# Altium schematic symbol library jlcpcb_2025_04_inductors_extended_0402.schlib: 1396 symbols (part 4 of 8) (continued)
## LQW15AN56NH00D
designator L?  Inductance: 56nH
Inductor, 56nH, ±3%, 1.17Ω, SMD 0402; Manufacturer: Murata Electronics; Manufacturer Part Number: LQW15AN56NH00D; Self-Resonant Frequency: 2.8GHz; Q Factor: 25@200MHz; Package Size: 0402; JLCPCB Basic Part: No; JLCPCB Part Number: C167483; Supplier 1: LCSC; Category: Inductors; Supplier Part Number 1: C167483; Tolerance: ±3%; DC Resistance: 1.17Ω; RoHS: Yes; ComponentLink1Description: Datasheet; ComponentLink1URL: https://wmsc.lcsc.com/wmsc/upload/file/pdf/v2/lcsc/2304140030_Murata-Electronics-LQW15AN56NH00D_C167483.pdf; ComponentLink2Description: JLCPCB Part URL; ComponentLink2URL: https://jlcpcb.com/partdetail/C167483; ComponentLink3Description: LCSC Part URL; ComponentLink3URL: https://lcsc.com/product-detail/Inductors-SMD_Murata-Electronics-Murata-Electronics-LQW15AN56NH00D_C167483.html
footprint IND-0402 (0402 (1005M) Inductor)
pins: 1, 2

## LQW15AN56NJ00D
designator L?  Inductance: 56nH
Inductor, 56nH, ±5%, 1.17Ω, 200mA, SMD 0402; Manufacturer: Murata Electronics; Manufacturer Part Number: LQW15AN56NJ00D; Self-Resonant Frequency: 2.8GHz; Q Factor: 25@200MHz; Package Size: 0402; JLCPCB Basic Part: No; JLCPCB Part Number: C167484; Supplier 1: LCSC; Category: Inductors; Supplier Part Number 1: C167484; Tolerance: ±5%; Rated Current: 200mA; DC Resistance: 1.17Ω; RoHS: Yes; ComponentLink1Description: Datasheet; ComponentLink1URL: https://wmsc.lcsc.com/wmsc/upload/file/pdf/v2/lcsc/2304140030_Murata-Electronics-LQW15AN56NJ00D_C167484.pdf; ComponentLink2Description: JLCPCB Part URL; ComponentLink2URL: https://jlcpcb.com/partdetail/C167484; ComponentLink3Description: LCSC Part URL; ComponentLink3URL: https://lcsc.com/product-detail/Inductors-SMD_Murata-Electronics-Murata-Electronics-LQW15AN56NJ00D_C167484.html
footprint IND-0402 (0402 (1005M) Inductor)
pins: 1, 2

## LQW15AN62NG00D
designator L?  Inductance: 62nH
Inductor, 62nH, ±2%, 1.82Ω, 145mA, SMD 0402; Manufacturer: Murata Electronics; Manufacturer Part Number: LQW15AN62NG00D; Self-Resonant Frequency: 2.6GHz; Q Factor: 20@200MHz; Package Size: 0402; JLCPCB Basic Part: No; JLCPCB Part Number: C167485; Supplier 1: LCSC; Category: Inductors; Supplier Part Number 1: C167485; Tolerance: ±2%; Rated Current: 145mA; DC Resistance: 1.82Ω; RoHS: Yes; ComponentLink1Description: Datasheet; ComponentLink1URL: https://wmsc.lcsc.com/wmsc/upload/file/pdf/v2/lcsc/2304140030_Murata-Electronics-LQW15AN62NG00D_C167485.pdf; ComponentLink2Description: JLCPCB Part URL; ComponentLink2URL: https://jlcpcb.com/partdetail/C167485; ComponentLink3Description: LCSC Part URL; ComponentLink3URL: https://lcsc.com/product-detail/Inductors-SMD_Murata-Electronics-Murata-Electronics-LQW15AN62NG00D_C167485.html
footprint IND-0402 (0402 (1005M) Inductor)
pins: 1, 2

## LQW15AN68NG00D
designator L?  Inductance: 68nH
Inductor, 68nH, ±2%, 1.96Ω, 140mA, SMD 0402; Manufacturer: Murata Electronics; Manufacturer Part Number: LQW15AN68NG00D; Self-Resonant Frequency: 2.5GHz; Q Factor: 20@200MHz; Package Size: 0402; JLCPCB Basic Part: No; JLCPCB Part Number: C108965; Supplier 1: LCSC; Category: Inductors; Supplier Part Number 1: C108965; Tolerance: ±2%; Rated Current: 140mA; DC Resistance: 1.96Ω; RoHS: Yes; ComponentLink1Description: Datasheet; ComponentLink1URL: https://wmsc.lcsc.com/wmsc/upload/file/pdf/v2/lcsc/1811081523_Murata-Electronics-LQW15AN68NG00D_C108965.pdf; ComponentLink2Description: JLCPCB Part URL; ComponentLink2URL: https://jlcpcb.com/partdetail/C108965; ComponentLink3Description: LCSC Part URL; ComponentLink3URL: https://lcsc.com/product-detail/Inductors-SMD_Murata-Electronics-Murata-Electronics-LQW15AN68NG00D_C108965.html
footprint IND-0402 (0402 (1005M) Inductor)
pins: 1, 2

## LQW15AN68NG8ZD
designator L?  Inductance: 68nH
Inductor, 68nH, ±2%, 1.128Ω, 320mA, SMD 0402; Manufacturer: Murata Electronics; Manufacturer Part Number: LQW15AN68NG8ZD; Self-Resonant Frequency: 2.5GHz; Q Factor: 25@200MHz; Package Size: 0402; JLCPCB Basic Part: No; JLCPCB Part Number: C2043784; Supplier 1: LCSC; Category: Inductors; Supplier Part Number 1: C2043784; Tolerance: ±2%; Rated Current: 320mA; DC Resistance: 1.128Ω; RoHS: Yes; ComponentLink1Description: Datasheet; ComponentLink1URL: https://wmsc.lcsc.com/wmsc/upload/file/pdf/v2/lcsc/2304140030_Murata-Electronics-LQW15AN68NG8ZD_C2043784.pdf; ComponentLink2Description: JLCPCB Part URL; ComponentLink2URL: https://jlcpcb.com/partdetail/C2043784; ComponentLink3Description: LCSC Part URL; ComponentLink3URL: https://lcsc.com/product-detail/Inductors-SMD_Murata-Electronics-Murata-Electronics-LQW15AN68NG8ZD_C2043784.html
footprint IND-0402 (0402 (1005M) Inductor)
pins: 1, 2

## LQW15AN68NJ80D
designator L?  Inductance: 68nH
Inductor, 68nH, ±5%, 1.128Ω, 320mA, SMD 0402; Manufacturer: Murata Electronics; Manufacturer Part Number: LQW15AN68NJ80D; Package Size: 0402; JLCPCB Basic Part: No; JLCPCB Part Number: C2041537; Supplier 1: LCSC; Category: Inductors; Supplier Part Number 1: C2041537; Tolerance: ±5%; Rated Current: 320mA; DC Resistance: 1.128Ω; RoHS: Yes; ComponentLink1Description: Datasheet; ComponentLink1URL: https://wmsc.lcsc.com/wmsc/upload/file/pdf/v2/lcsc/2304140030_Murata-Electronics-LQW15AN68NJ80D_C2041537.pdf; ComponentLink2Description: JLCPCB Part URL; ComponentLink2URL: https://jlcpcb.com/partdetail/C2041537; ComponentLink3Description: LCSC Part URL; ComponentLink3URL: https://lcsc.com/product-detail/Power-Inductors_Murata-Electronics-Murata-Electronics-LQW15AN68NJ80D_C2041537.html
footprint IND-0402 (0402 (1005M) Inductor)
pins: 1, 2

## LQW15AN75NG00D
designator L?  Inductance: 75nH
Inductor, 75nH, ±2%, 2.1Ω, 135mA, SMD 0402; Manufacturer: Murata Electronics; Manufacturer Part Number: LQW15AN75NG00D; Package Size: 0402; JLCPCB Basic Part: No; JLCPCB Part Number: C341787; Supplier 1: LCSC; Category: Inductors; Supplier Part Number 1: C341787; Tolerance: ±2%; Rated Current: 135mA; DC Resistance: 2.1Ω; RoHS: Yes; ComponentLink1Description: Datasheet; ComponentLink1URL: https://wmsc.lcsc.com/wmsc/upload/file/pdf/v2/lcsc/2304140030_Murata-Electronics-LQW15AN75NG00D_C341787.pdf; ComponentLink2Description: JLCPCB Part URL; ComponentLink2URL: https://jlcpcb.com/partdetail/C341787; ComponentLink3Description: LCSC Part URL; ComponentLink3URL: https://lcsc.com/product-detail/Power-Inductors_Murata-Electronics-Murata-Electronics-LQW15AN75NG00D_C341787.html
footprint IND-0402 (0402 (1005M) Inductor)
pins: 1, 2

## LQW15AN75NG80D
designator L?  Inductance: 75nH
Inductor, 75nH, ±2%, 1.224Ω, 320mA, SMD 0402; Manufacturer: Murata Electronics; Manufacturer Part Number: LQW15AN75NG80D; Package Size: 0402; JLCPCB Basic Part: No; JLCPCB Part Number: C2044453; Supplier 1: LCSC; Category: Inductors; Supplier Part Number 1: C2044453; Tolerance: ±2%; Rated Current: 320mA; DC Resistance: 1.224Ω; RoHS: Yes; ComponentLink1Description: Datasheet; ComponentLink1URL: https://wmsc.lcsc.com/wmsc/upload/file/pdf/v2/lcsc/2304140030_Murata-Electronics-LQW15AN75NG80D_C2044453.pdf; ComponentLink2Description: JLCPCB Part URL; ComponentLink2URL: https://jlcpcb.com/partdetail/C2044453; ComponentLink3Description: LCSC Part URL; ComponentLink3URL: https://lcsc.com/product-detail/Power-Inductors_Murata-Electronics-Murata-Electronics-LQW15AN75NG80D_C2044453.html
footprint IND-0402 (0402 (1005M) Inductor)
pins: 1, 2

## LQW15AN75NJ00D
designator L?  Inductance: 75nH
Inductor, 75nH, ±5%, 2.1Ω, 135mA, SMD 0402; Manufacturer: Murata Electronics; Manufacturer Part Number: LQW15AN75NJ00D; Package Size: 0402; JLCPCB Basic Part: No; JLCPCB Part Number: C603136; Supplier 1: LCSC; Category: Inductors; Supplier Part Number 1: C603136; Tolerance: ±5%; Rated Current: 135mA; DC Resistance: 2.1Ω; RoHS: Yes; ComponentLink1Description: Datasheet; ComponentLink1URL: https://wmsc.lcsc.com/wmsc/upload/file/pdf/v2/lcsc/2009091507_Murata-Electronics-LQW15AN75NJ00D_C603136.pdf; ComponentLink2Description: JLCPCB Part URL; ComponentLink2URL: https://jlcpcb.com/partdetail/C603136; ComponentLink3Description: LCSC Part URL; ComponentLink3URL: https://lcsc.com/product-detail/Power-Inductors_Murata-Electronics-Murata-Electronics-LQW15AN75NJ00D_C603136.html
footprint IND-0402 (0402 (1005M) Inductor)
pins: 1, 2

## LQW15AN82NG00D
designator L?  Inductance: 82nH
Inductor, 82nH, ±2%, 2.24Ω, SMD 0402; Manufacturer: Murata Electronics; Manufacturer Part Number: LQW15AN82NG00D; Self-Resonant Frequency: 2.3GHz; Q Factor: 20@150MHz; Package Size: 0402; JLCPCB Basic Part: No; JLCPCB Part Number: C167487; Supplier 1: LCSC; Category: Inductors; Supplier Part Number 1: C167487; Tolerance: ±2%; DC Resistance: 2.24Ω; RoHS: Yes; ComponentLink1Description: Datasheet; ComponentLink1URL: https://wmsc.lcsc.com/wmsc/upload/file/pdf/v2/lcsc/2304140030_Murata-Electronics-LQW15AN82NG00D_C167487.pdf; ComponentLink2Description: JLCPCB Part URL; ComponentLink2URL: https://jlcpcb.com/partdetail/C167487; ComponentLink3Description: LCSC Part URL; ComponentLink3URL: https://lcsc.com/product-detail/Inductors-SMD_Murata-Electronics-Murata-Electronics-LQW15AN82NG00D_C167487.html
footprint IND-0402 (0402 (1005M) Inductor)
pins: 1, 2

## LQW15AN82NJ00D
designator L?  Inductance: 82nH
Inductor, 82nH, ±5%, 2.24Ω, 130mA, SMD 0402; Manufacturer: Murata Electronics; Manufacturer Part Number: LQW15AN82NJ00D; Self-Resonant Frequency: 2.3GHz; Q Factor: 20@150MHz; Package Size: 0402; JLCPCB Basic Part: No; JLCPCB Part Number: C167488; Supplier 1: LCSC; Category: Inductors; Supplier Part Number 1: C167488; Tolerance: ±5%; Rated Current: 130mA; DC Resistance: 2.24Ω; RoHS: Yes; ComponentLink1Description: Datasheet; ComponentLink1URL: https://wmsc.lcsc.com/wmsc/upload/file/pdf/v2/lcsc/2304140030_Murata-Electronics-LQW15AN82NJ00D_C167488.pdf; ComponentLink2Description: JLCPCB Part URL; ComponentLink2URL: https://jlcpcb.com/partdetail/C167488; ComponentLink3Description: LCSC Part URL; ComponentLink3URL: https://lcsc.com/product-detail/Inductors-SMD_Murata-Electronics-Murata-Electronics-LQW15AN82NJ00D_C167488.html
footprint IND-0402 (0402 (1005M) Inductor)
pins: 1, 2

## LQW15AN91NG00D
designator L?  Inductance: 91nH
Inductor, 91nH, ±2%, 2.38Ω, 125mA, SMD 0402; Manufacturer: Murata Electronics; Manufacturer Part Number: LQW15AN91NG00D; Self-Resonant Frequency: 2.1GHz; Q Factor: 20@150MHz; Package Size: 0402; JLCPCB Basic Part: No; JLCPCB Part Number: C113121; Supplier 1: LCSC; Category: Inductors; Supplier Part Number 1: C113121; Tolerance: ±2%; Rated Current: 125mA; DC Resistance: 2.38Ω; RoHS: Yes; ComponentLink1Description: Datasheet; ComponentLink1URL: https://wmsc.lcsc.com/wmsc/upload/file/pdf/v2/lcsc/2304140030_Murata-Electronics-LQW15AN91NG00D_C113121.pdf; ComponentLink2Description: JLCPCB Part URL; ComponentLink2URL: https://jlcpcb.com/partdetail/C113121; ComponentLink3Description: LCSC Part URL; ComponentLink3URL: https://lcsc.com/product-detail/Inductors-SMD_Murata-Electronics-Murata-Electronics-LQW15AN91NG00D_C113121.html
footprint IND-0402 (0402 (1005M) Inductor)
pins: 1, 2

## LQW15ANR10J00D
designator L?  Inductance: 100nH
Inductor, 100nH, ±5%, 2.52Ω, 120mA, SMD 0402; Manufacturer: Murata Electronics; Manufacturer Part Number: LQW15ANR10J00D; Self-Resonant Frequency: 1.5GHz; Q Factor: 20@150MHz; Package Size: 0402; JLCPCB Basic Part: No; JLCPCB Part Number: C86130; Supplier 1: LCSC; Category: Inductors; Supplier Part Number 1: C86130; Tolerance: ±5%; Rated Current: 120mA; DC Resistance: 2.52Ω; RoHS: Yes; ComponentLink1Description: Datasheet; ComponentLink1URL: https://wmsc.lcsc.com/wmsc/upload/file/pdf/v2/lcsc/1811081610_Murata-Electronics-LQW15ANR10J00D_C86130.pdf; ComponentLink2Description: JLCPCB Part URL; ComponentLink2URL: https://jlcpcb.com/partdetail/C86130; ComponentLink3Description: LCSC Part URL; ComponentLink3URL: https://lcsc.com/product-detail/Inductors-SMD_Murata-Electronics-Murata-Electronics-LQW15ANR10J00D_C86130.html
footprint IND-0402 (0402 (1005M) Inductor)
pins: 1, 2

## LQW15ANR12J00D
designator L?  Inductance: 120nH
Inductor, 120nH, ±5%, 2.66Ω, SMD 0402; Manufacturer: Murata Electronics; Manufacturer Part Number: LQW15ANR12J00D; Self-Resonant Frequency: 1GHz; Q Factor: 20@150MHz; Package Size: 0402; JLCPCB Basic Part: No; JLCPCB Part Number: C113123; Supplier 1: LCSC; Category: Inductors; Supplier Part Number 1: C113123; Tolerance: ±5%; DC Resistance: 2.66Ω; RoHS: Yes; ComponentLink1Description: Datasheet; ComponentLink1URL: https://wmsc.lcsc.com/wmsc/upload/file/pdf/v2/lcsc/2304140030_Murata-Electronics-LQW15ANR12J00D_C113123.pdf; ComponentLink2Description: JLCPCB Part URL; ComponentLink2URL: https://jlcpcb.com/partdetail/C113123; ComponentLink3Description: LCSC Part URL; ComponentLink3URL: https://lcsc.com/product-detail/Inductors-SMD_Murata-Electronics-Murata-Electronics-LQW15ANR12J00D_C113123.html
footprint IND-0402 (0402 (1005M) Inductor)
pins: 1, 2

## LQW15CA1R0K00D
designator L?  Inductance: 1000nH
Inductor, 1000nH, ±10%, 2.2Ω, 180mA, SMD 0402; Manufacturer: Murata Electronics; Manufacturer Part Number: LQW15CA1R0K00D; Self-Resonant Frequency: 400MHz; Package Size: 0402; JLCPCB Basic Part: No; JLCPCB Part Number: C703738; Supplier 1: LCSC; Category: Inductors; Supplier Part Number 1: C703738; Tolerance: ±10%; Rated Current: 180mA; DC Resistance: 2.2Ω; RoHS: Yes; ComponentLink1Description: Datasheet; ComponentLink1URL: https://wmsc.lcsc.com/wmsc/upload/file/pdf/v2/lcsc/2304140030_Murata-Electronics-LQW15CA1R0K00D_C703738.pdf; ComponentLink2Description: JLCPCB Part URL; ComponentLink2URL: https://jlcpcb.com/partdetail/C703738; ComponentLink3Description: LCSC Part URL; ComponentLink3URL: https://lcsc.com/product-detail/Inductors-SMD_Murata-Electronics-Murata-Electronics-LQW15CA1R0K00D_C703738.html
footprint IND-0402 (0402 (1005M) Inductor)
pins: 1, 2

## LQW15CA22NK00D
designator L?  Inductance: 22nH
Inductor, 22nH, ±10%, 60mΩ, 1.3A, SMD 0402; Manufacturer: Murata Electronics; Manufacturer Part Number: LQW15CA22NK00D; Package Size: 0402; JLCPCB Basic Part: No; JLCPCB Part Number: C703737; Supplier 1: LCSC; Category: Inductors; Supplier Part Number 1: C703737; Tolerance: ±10%; Rated Current: 1.3A; DC Resistance: 60mΩ; RoHS: Yes; ComponentLink1Description: Datasheet; ComponentLink1URL: https://wmsc.lcsc.com/wmsc/upload/file/pdf/v2/lcsc/2304140030_Murata-Electronics-LQW15CA22NK00D_C703737.pdf; ComponentLink2Description: JLCPCB Part URL; ComponentLink2URL: https://jlcpcb.com/partdetail/C703737; ComponentLink3Description: LCSC Part URL; ComponentLink3URL: https://lcsc.com/product-detail/Power-Inductors_Murata-Electronics-Murata-Electronics-LQW15CA22NK00D_C703737.html
footprint IND-0402 (0402 (1005M) Inductor)
pins: 1, 2

## LQW15CAR27J00D
designator L?  Inductance: 270nH
Inductor, 270nH, ±5%, 380mΩ, 480mA, SMD 0402; Manufacturer: Murata Electronics; Manufacturer Part Number: LQW15CAR27J00D; Package Size: 0402; JLCPCB Basic Part: No; JLCPCB Part Number: C703734; Supplier 1: LCSC; Category: Inductors; Supplier Part Number 1: C703734; Tolerance: ±5%; Rated Current: 480mA; DC Resistance: 380mΩ; RoHS: Yes; ComponentLink1Description: Datasheet; ComponentLink1URL: https://wmsc.lcsc.com/wmsc/upload/file/pdf/v2/lcsc/2304140030_Murata-Electronics-LQW15CAR27J00D_C703734.pdf; ComponentLink2Description: JLCPCB Part URL; ComponentLink2URL: https://jlcpcb.com/partdetail/C703734; ComponentLink3Description: LCSC Part URL; ComponentLink3URL: https://lcsc.com/product-detail/Power-Inductors_Murata-Electronics-Murata-Electronics-LQW15CAR27J00D_C703734.html
footprint IND-0402 (0402 (1005M) Inductor)
pins: 1, 2

## LQW15CAR43J00D
designator L?  Inductance: 430nH
Inductor, 430nH, ±5%, 680mΩ, 360mA, SMD 0402; Manufacturer: Murata Electronics; Manufacturer Part Number: LQW15CAR43J00D; Self-Resonant Frequency: 920MHz; Package Size: 0402; JLCPCB Basic Part: No; JLCPCB Part Number: C703733; Supplier 1: LCSC; Category: Inductors; Supplier Part Number 1: C703733; Tolerance: ±5%; Rated Current: 360mA; DC Resistance: 680mΩ; RoHS: Yes; ComponentLink1Description: Datasheet; ComponentLink1URL: https://wmsc.lcsc.com/wmsc/upload/file/pdf/v2/lcsc/2304140030_Murata-Electronics-LQW15CAR43J00D_C703733.pdf; ComponentLink2Description: JLCPCB Part URL; ComponentLink2URL: https://jlcpcb.com/partdetail/C703733; ComponentLink3Description: LCSC Part URL; ComponentLink3URL: https://lcsc.com/product-detail/Inductors-SMD_Murata-Electronics-Murata-Electronics-LQW15CAR43J00D_C703733.html
footprint IND-0402 (0402 (1005M) Inductor)
pins: 1, 2

## LQW15CAR50J00D
designator L?  Inductance: 500nH
Inductor, 500nH, ±5%, 970mΩ, 270mA, SMD 0402; Manufacturer: Murata Electronics; Manufacturer Part Number: LQW15CAR50J00D; Package Size: 0402; JLCPCB Basic Part: No; JLCPCB Part Number: C703732; Supplier 1: LCSC; Category: Inductors; Supplier Part Number 1: C703732; Tolerance: ±5%; Rated Current: 270mA; DC Resistance: 970mΩ; RoHS: Yes; ComponentLink1Description: Datasheet; ComponentLink1URL: https://wmsc.lcsc.com/wmsc/upload/file/pdf/v2/lcsc/2304140030_Murata-Electronics-LQW15CAR50J00D_C703732.pdf; ComponentLink2Description: JLCPCB Part URL; ComponentLink2URL: https://jlcpcb.com/partdetail/C703732; ComponentLink3Description: LCSC Part URL; ComponentLink3URL: https://lcsc.com/product-detail/Power-Inductors_Murata-Electronics-Murata-Electronics-LQW15CAR50J00D_C703732.html
footprint IND-0402 (0402 (1005M) Inductor)
pins: 1, 2

## LQW15CAR56J00D
designator L?  Inductance: 560nH
Inductor, 560nH, ±5%, 1Ω, 270mA, SMD 0402; Manufacturer: Murata Electronics; Manufacturer Part Number: LQW15CAR56J00D; Package Size: 0402; JLCPCB Basic Part: No; JLCPCB Part Number: C237606; Supplier 1: LCSC; Category: Inductors; Supplier Part Number 1: C237606; Tolerance: ±5%; Rated Current: 270mA; DC Resistance: 1Ω; RoHS: Yes; ComponentLink1Description: Datasheet; ComponentLink1URL: https://wmsc.lcsc.com/wmsc/upload/file/pdf/v2/lcsc/2304140030_Murata-Electronics-LQW15CAR56J00D_C237606.pdf; ComponentLink2Description: JLCPCB Part URL; ComponentLink2URL: https://jlcpcb.com/partdetail/C237606; ComponentLink3Description: LCSC Part URL; ComponentLink3URL: https://lcsc.com/product-detail/Power-Inductors_Murata-Electronics-Murata-Electronics-LQW15CAR56J00D_C237606.html
footprint IND-0402 (0402 (1005M) Inductor)
pins: 1, 2

## LQW15CAR73J00D
designator L?  Inductance: 730nH
Inductor, 730nH, ±5%, 1.95Ω, SMD 0402; Manufacturer: Murata Electronics; Manufacturer Part Number: LQW15CAR73J00D; Self-Resonant Frequency: 810MHz; Package Size: 0402; JLCPCB Basic Part: No; JLCPCB Part Number: C527587; Supplier 1: LCSC; Category: Inductors; Supplier Part Number 1: C527587; Tolerance: ±5%; DC Resistance: 1.95Ω; RoHS: Yes; ComponentLink1Description: Datasheet; ComponentLink1URL: https://wmsc.lcsc.com/wmsc/upload/file/pdf/v2/lcsc/2008051835_Murata-Electronics-LQW15CAR73J00D_C527587.pdf; ComponentLink2Description: JLCPCB Part URL; ComponentLink2URL: https://jlcpcb.com/partdetail/C527587; ComponentLink3Description: LCSC Part URL; ComponentLink3URL: https://lcsc.com/product-detail/Inductors-SMD_Murata-Electronics-Murata-Electronics-LQW15CAR73J00D_C527587.html
footprint IND-0402 (0402 (1005M) Inductor)
pins: 1, 2

## LQW15CN1R0M10D
designator L?  Inductance: 1uH
Inductor, 1uH, ±20%, 940mΩ, 270mA, SMD 0402; Manufacturer: Murata Electronics; Manufacturer Part Number: LQW15CN1R0M10D; Package Size: 0402; JLCPCB Basic Part: No; JLCPCB Part Number: C703068; Supplier 1: LCSC; Category: Inductors; Supplier Part Number 1: C703068; Tolerance: ±20%; Rated Current: 270mA; DC Resistance: 940mΩ; RoHS: Yes; ComponentLink1Description: Datasheet; ComponentLink1URL: https://wmsc.lcsc.com/wmsc/upload/file/pdf/v2/lcsc/2304140030_Murata-Electronics-LQW15CN1R0M10D_C703068.pdf; ComponentLink2Description: JLCPCB Part URL; ComponentLink2URL: https://jlcpcb.com/partdetail/C703068; ComponentLink3Description: LCSC Part URL; ComponentLink3URL: https://lcsc.com/product-detail/Power-Inductors_Murata-Electronics-Murata-Electronics-LQW15CN1R0M10D_C703068.html
footprint IND-0402 (0402 (1005M) Inductor)
pins: 1, 2

## LQW15CN2R2M10D
designator L?  Inductance: 2200nH
Inductor, 2200nH, ±20%, 1.8Ω, 170mA, SMD 0402; Manufacturer: Murata Electronics; Manufacturer Part Number: LQW15CN2R2M10D; Self-Resonant Frequency: 100MHz; Package Size: 0402; JLCPCB Basic Part: No; JLCPCB Part Number: C333990; Supplier 1: LCSC; Category: Inductors; Supplier Part Number 1: C333990; Tolerance: ±20%; Rated Current: 170mA; DC Resistance: 1.8Ω; RoHS: Yes; ComponentLink1Description: Datasheet; ComponentLink1URL: https://wmsc.lcsc.com/wmsc/upload/file/pdf/v2/lcsc/1912111437_Murata-Electronics-LQW15CN2R2M10D_C333990.pdf; ComponentLink2Description: JLCPCB Part URL; ComponentLink2URL: https://jlcpcb.com/partdetail/C333990; ComponentLink3Description: LCSC Part URL; ComponentLink3URL: https://lcsc.com/product-detail/Inductors-SMD_Murata-Electronics-Murata-Electronics-LQW15CN2R2M10D_C333990.html
footprint IND-0402 (0402 (1005M) Inductor)
pins: 1, 2

## LQW15CN18NJ00D
designator L?  Inductance: 18nH
Inductor, 18nH, ±5%, 46mΩ, 1.4A, SMD 0402; Manufacturer: Murata Electronics; Manufacturer Part Number: LQW15CN18NJ00D; Package Size: 0402; JLCPCB Basic Part: No; JLCPCB Part Number: C437365; Supplier 1: LCSC; Category: Inductors; Supplier Part Number 1: C437365; Tolerance: ±5%; Rated Current: 1.4A; DC Resistance: 46mΩ; RoHS: Yes; ComponentLink1Description: Datasheet; ComponentLink1URL: https://wmsc.lcsc.com/wmsc/upload/file/pdf/v2/lcsc/2001071133_Murata-Electronics-LQW15CN18NJ00D_C437365.pdf; ComponentLink2Description: JLCPCB Part URL; ComponentLink2URL: https://jlcpcb.com/partdetail/C437365; ComponentLink3Description: LCSC Part URL; ComponentLink3URL: https://lcsc.com/product-detail/Power-Inductors_Murata-Electronics-Murata-Electronics-LQW15CN18NJ00D_C437365.html
footprint IND-0402 (0402 (1005M) Inductor)
pins: 1, 2

## LQW15CN34NJ10D
designator L?  Inductance: 34nH
Inductor, 34nH, ±5%, 36mΩ, SMD 0402; Manufacturer: Murata Electronics; Manufacturer Part Number: LQW15CN34NJ10D; Self-Resonant Frequency: 2.5GHz; Package Size: 0402; JLCPCB Basic Part: No; JLCPCB Part Number: C907959; Supplier 1: LCSC; Category: Inductors; Supplier Part Number 1: C907959; Tolerance: ±5%; DC Resistance: 36mΩ; RoHS: Yes; ComponentLink1Description: Datasheet; ComponentLink1URL: https://wmsc.lcsc.com/wmsc/upload/file/pdf/v2/lcsc/2304140030_Murata-Electronics-LQW15CN34NJ10D_C907959.pdf; ComponentLink2Description: JLCPCB Part URL; ComponentLink2URL: https://jlcpcb.com/partdetail/C907959; ComponentLink3Description: LCSC Part URL; ComponentLink3URL: https://lcsc.com/product-detail/Inductors-SMD_Murata-Electronics-Murata-Electronics-LQW15CN34NJ10D_C907959.html
footprint IND-0402 (0402 (1005M) Inductor)
pins: 1, 2

## LQW15CN77NJ10D
designator L?  Inductance: 77nH
Inductor, 77nH, ±5%, 90mΩ, SMD 0402; Manufacturer: Murata Electronics; Manufacturer Part Number: LQW15CN77NJ10D; Self-Resonant Frequency: 2GHz; Package Size: 0402; JLCPCB Basic Part: No; JLCPCB Part Number: C668466; Supplier 1: LCSC; Category: Inductors; Supplier Part Number 1: C668466; Tolerance: ±5%; DC Resistance: 90mΩ; RoHS: Yes; ComponentLink1Description: Datasheet; ComponentLink1URL: https://wmsc.lcsc.com/wmsc/upload/file/pdf/v2/lcsc/2304140030_Murata-Electronics-LQW15CN77NJ10D_C668466.pdf; ComponentLink2Description: JLCPCB Part URL; ComponentLink2URL: https://jlcpcb.com/partdetail/C668466; ComponentLink3Description: LCSC Part URL; ComponentLink3URL: https://lcsc.com/product-detail/Inductors-SMD_Murata-Electronics-Murata-Electronics-LQW15CN77NJ10D_C668466.html
footprint IND-0402 (0402 (1005M) Inductor)
pins: 1, 2

## LQW15CNR16J00D
designator L?  Inductance: 160nH
Inductor, 160nH, ±5%, 330mΩ, 480mA, SMD 0402; Manufacturer: Murata Electronics; Manufacturer Part Number: LQW15CNR16J00D; Package Size: 0402; JLCPCB Basic Part: No; JLCPCB Part Number: C703071; Supplier 1: LCSC; Category: Inductors; Supplier Part Number 1: C703071; Tolerance: ±5%; Rated Current: 480mA; DC Resistance: 330mΩ; RoHS: Yes; ComponentLink1Description: Datasheet; ComponentLink1URL: https://wmsc.lcsc.com/wmsc/upload/file/pdf/v2/lcsc/2304140030_Murata-Electronics-LQW15CNR16J00D_C703071.pdf; ComponentLink2Description: JLCPCB Part URL; ComponentLink2URL: https://jlcpcb.com/partdetail/C703071; ComponentLink3Description: LCSC Part URL; ComponentLink3URL: https://lcsc.com/product-detail/Power-Inductors_Murata-Electronics-Murata-Electronics-LQW15CNR16J00D_C703071.html
footprint IND-0402 (0402 (1005M) Inductor)
pins: 1, 2

## LQW15CNR18J1ZD
designator L?  Inductance: 180nH
Inductor, 180nH, ±5%, 312mΩ, 560mA, SMD 0402; Manufacturer: Murata Electronics; Manufacturer Part Number: LQW15CNR18J1ZD; Package Size: 0402; JLCPCB Basic Part: No; JLCPCB Part Number: C711178; Supplier 1: LCSC; Category: Inductors; Supplier Part Number 1: C711178; Tolerance: ±5%; Rated Current: 560mA; DC Resistance: 312mΩ; RoHS: Yes; ComponentLink1Description: Datasheet; ComponentLink1URL: https://wmsc.lcsc.com/wmsc/upload/file/pdf/v2/lcsc/2304140030_Murata-Electronics-LQW15CNR18J1ZD_C711178.pdf; ComponentLink2Description: JLCPCB Part URL; ComponentLink2URL: https://jlcpcb.com/partdetail/C711178; ComponentLink3Description: LCSC Part URL; ComponentLink3URL: https://lcsc.com/product-detail/Power-Inductors_Murata-Electronics-Murata-Electronics-LQW15CNR18J1ZD_C711178.html
footprint IND-0402 (0402 (1005M) Inductor)
pins: 1, 2

## LQW15CNR22J10D
designator L?  Inductance: 220nH
Inductor, 220nH, ±5%, 470mΩ, 450mA, SMD 0402; Manufacturer: Murata Electronics; Manufacturer Part Number: LQW15CNR22J10D; Self-Resonant Frequency: 1.4GHz; Package Size: 0402; JLCPCB Basic Part: No; JLCPCB Part Number: C341690; Supplier 1: LCSC; Category: Inductors; Supplier Part Number 1: C341690; Tolerance: ±5%; Rated Current: 450mA; DC Resistance: 470mΩ; RoHS: Yes; ComponentLink1Description: Datasheet; ComponentLink1URL: https://wmsc.lcsc.com/wmsc/upload/file/pdf/v2/lcsc/2304140030_Murata-Electronics-LQW15CNR22J10D_C341690.pdf; ComponentLink2Description: JLCPCB Part URL; ComponentLink2URL: https://jlcpcb.com/partdetail/C341690; ComponentLink3Description: LCSC Part URL; ComponentLink3URL: https://lcsc.com/product-detail/Inductors-SMD_Murata-Electronics-Murata-Electronics-LQW15CNR22J10D_C341690.html
footprint IND-0402 (0402 (1005M) Inductor)
pins: 1, 2

## LQW15CNR27J10D
designator L?  Inductance: 270nH
Inductor, 270nH, ±5%, 520mΩ, 420mA, SMD 0402; Manufacturer: Murata Electronics; Manufacturer Part Number: LQW15CNR27J10D; Package Size: 0402; JLCPCB Basic Part: No; JLCPCB Part Number: C703731; Supplier 1: LCSC; Category: Inductors; Supplier Part Number 1: C703731; Tolerance: ±5%; Rated Current: 420mA; DC Resistance: 520mΩ; RoHS: Yes; ComponentLink1Description: Datasheet; ComponentLink1URL: https://wmsc.lcsc.com/wmsc/upload/file/pdf/v2/lcsc/2304140030_Murata-Electronics-LQW15CNR27J10D_C703731.pdf; ComponentLink2Description: JLCPCB Part URL; ComponentLink2URL: https://jlcpcb.com/partdetail/C703731; ComponentLink3Description: LCSC Part URL; ComponentLink3URL: https://lcsc.com/product-detail/Power-Inductors_Murata-Electronics-Murata-Electronics-LQW15CNR27J10D_C703731.html
footprint IND-0402 (0402 (1005M) Inductor)
pins: 1, 2

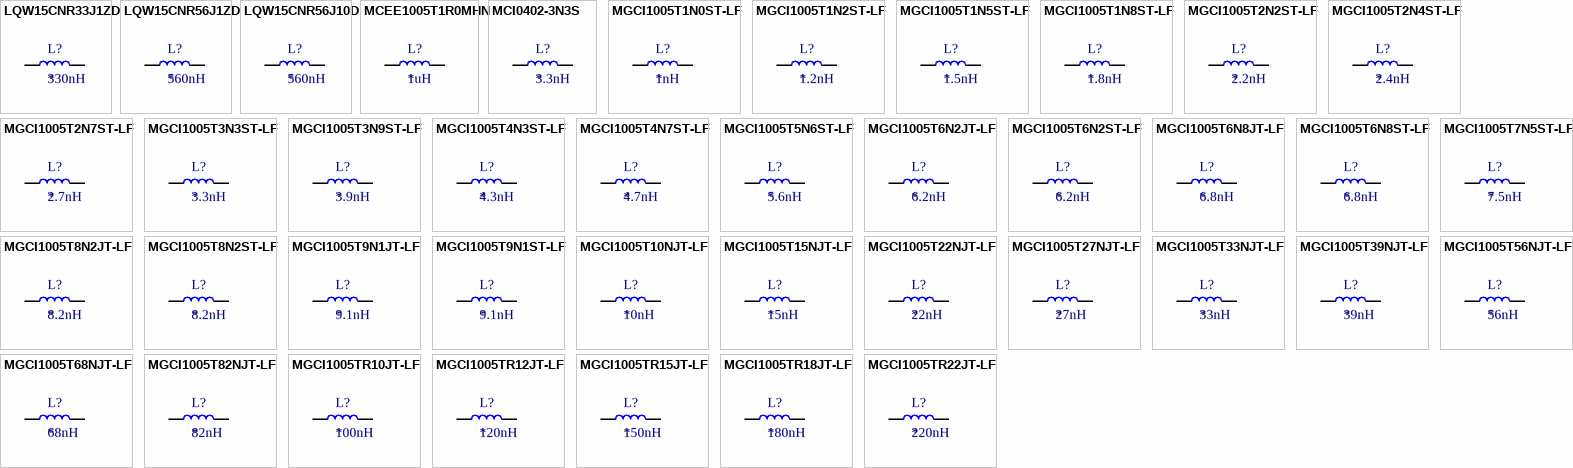
[diagram p17: symbols LQW15CNR33J1ZD to MGCI1005TR22JT-LF]

## LQW15CNR33J1ZD
designator L?  Inductance: 330nH
Inductor, 330nH, ±5%, 560mΩ, null, SMD 0402; Manufacturer: Murata Electronics; Manufacturer Part Number: LQW15CNR33J1ZD; Package Size: 0402; JLCPCB Basic Part: No; JLCPCB Part Number: C703064; Supplier 1: LCSC; Category: Inductors; Supplier Part Number 1: C703064; Tolerance: ±5%; Rated Current: null; DC Resistance: 560mΩ; RoHS: Yes; ComponentLink1Description: Datasheet; ComponentLink1URL: https://wmsc.lcsc.com/wmsc/upload/file/pdf/v2/lcsc/2304140030_Murata-Electronics-LQW15CNR33J1ZD_C703064.pdf; ComponentLink2Description: JLCPCB Part URL; ComponentLink2URL: https://jlcpcb.com/partdetail/C703064; ComponentLink3Description: LCSC Part URL; ComponentLink3URL: https://lcsc.com/product-detail/Power-Inductors_Murata-Electronics-Murata-Electronics-LQW15CNR33J1ZD_C703064.html
footprint IND-0402 (0402 (1005M) Inductor)
pins: 1, 2

## LQW15CNR56J1ZD
designator L?  Inductance: 560nH
Inductor, 560nH, ±5%, 710mΩ, 300mA, SMD 0402; Manufacturer: Murata Electronics; Manufacturer Part Number: LQW15CNR56J1ZD; Package Size: 0402; JLCPCB Basic Part: No; JLCPCB Part Number: C883554; Supplier 1: LCSC; Category: Inductors; Supplier Part Number 1: C883554; Tolerance: ±5%; Rated Current: 300mA; DC Resistance: 710mΩ; RoHS: Yes; ComponentLink1Description: Datasheet; ComponentLink1URL: https://wmsc.lcsc.com/wmsc/upload/file/pdf/v2/lcsc/2201242130_Murata-Electronics-LQW15CNR56J1ZD_C883554.pdf; ComponentLink2Description: JLCPCB Part URL; ComponentLink2URL: https://jlcpcb.com/partdetail/C883554; ComponentLink3Description: LCSC Part URL; ComponentLink3URL: https://lcsc.com/product-detail/Power-Inductors_Murata-Electronics-Murata-Electronics-LQW15CNR56J1ZD_C883554.html
footprint IND-0402 (0402 (1005M) Inductor)
pins: 1, 2

## LQW15CNR56J10D
designator L?  Inductance: 560nH
Inductor, 560nH, ±5%, 710mΩ, 300mA, SMD 0402; Manufacturer: Murata Electronics; Manufacturer Part Number: LQW15CNR56J10D; Package Size: 0402; JLCPCB Basic Part: No; JLCPCB Part Number: C269831; Supplier 1: LCSC; Category: Inductors; Supplier Part Number 1: C269831; Tolerance: ±5%; Rated Current: 300mA; DC Resistance: 710mΩ; RoHS: Yes; ComponentLink1Description: Datasheet; ComponentLink1URL: https://wmsc.lcsc.com/wmsc/upload/file/pdf/v2/lcsc/2304140030_Murata-Electronics-LQW15CNR56J10D_C269831.pdf; ComponentLink2Description: JLCPCB Part URL; ComponentLink2URL: https://jlcpcb.com/partdetail/C269831; ComponentLink3Description: LCSC Part URL; ComponentLink3URL: https://lcsc.com/product-detail/Power-Inductors_Murata-Electronics-Murata-Electronics-LQW15CNR56J10D_C269831.html
footprint IND-0402 (0402 (1005M) Inductor)
pins: 1, 2

## MCEE1005T1R0MHN
designator L?  Inductance: 1uH
Inductor, 1uH, ±20%, 300mΩ, 800mA, SMD 0402; Manufacturer: Taiyo Yuden; Manufacturer Part Number: MCEE1005T1R0MHN; Saturation Current: 1A; Package Size: 0402; JLCPCB Basic Part: No; JLCPCB Part Number: C2043465; Supplier 1: LCSC; Category: Inductors; Supplier Part Number 1: C2043465; Tolerance: ±20%; Rated Current: 800mA; DC Resistance: 300mΩ; RoHS: Yes; ComponentLink1Description: Datasheet; ComponentLink1URL: https://wmsc.lcsc.com/wmsc/upload/file/pdf/v2/lcsc/2309051353_Taiyo-Yuden-MCEE1005T1R0MHN_C2043465.pdf; ComponentLink2Description: JLCPCB Part URL; ComponentLink2URL: https://jlcpcb.com/partdetail/C2043465; ComponentLink3Description: LCSC Part URL; ComponentLink3URL: https://lcsc.com/product-detail/Inductors-SMD_Taiyo-Yuden-Taiyo-Yuden-MCEE1005T1R0MHN_C2043465.html
footprint IND-0402 (0402 (1005M) Inductor)
pins: 1, 2

## MCI0402-3N3S
designator L?  Inductance: 3.3nH
Inductor, 3.3nH, 190mΩ, 300mA, SMD 0402; Manufacturer: KOHERelec; Manufacturer Part Number: MCI0402-3N3S; Self-Resonant Frequency: 8.5GHz; Package Size: 0402; JLCPCB Basic Part: No; JLCPCB Part Number: C2922558; Supplier 1: LCSC; Category: Inductors; Supplier Part Number 1: C2922558; Rated Current: 300mA; DC Resistance: 190mΩ; RoHS: Yes; ComponentLink1Description: Datasheet; ComponentLink1URL: https://wmsc.lcsc.com/wmsc/upload/file/pdf/v2/lcsc/2112021830_KOHERelec-MCI0402-3N3S_C2922558.pdf; ComponentLink2Description: JLCPCB Part URL; ComponentLink2URL: https://jlcpcb.com/partdetail/C2922558; ComponentLink3Description: LCSC Part URL; ComponentLink3URL: https://lcsc.com/product-detail/Inductors-SMD_KOHERelec-KOHERelec-MCI0402-3N3S_C2922558.html
footprint IND-0402 (0402 (1005M) Inductor)
pins: 1, 2

## MGCI1005T1N0ST-LF
designator L?  Inductance: 1nH
Inductor, 1nH, 80mΩ, 400mA, SMD 0402; Manufacturer: microgate; Manufacturer Part Number: MGCI1005T1N0ST-LF; Package Size: 0402; JLCPCB Basic Part: No; JLCPCB Part Number: C280985; Supplier 1: LCSC; Category: Inductors; Supplier Part Number 1: C280985; Rated Current: 400mA; DC Resistance: 80mΩ; RoHS: Yes; ComponentLink1Description: Datasheet; ComponentLink1URL: https://wmsc.lcsc.com/wmsc/upload/file/pdf/v2/lcsc/2304140030_microgate-MGCI1005T1N0ST-LF_C280985.pdf; ComponentLink2Description: JLCPCB Part URL; ComponentLink2URL: https://jlcpcb.com/partdetail/C280985; ComponentLink3Description: LCSC Part URL; ComponentLink3URL: https://lcsc.com/product-detail/Inductors-SMD_microgate-microgate-MGCI1005T1N0ST-LF_C280985.html
footprint IND-0402 (0402 (1005M) Inductor)
pins: 1, 2

## MGCI1005T1N2ST-LF
designator L?  Inductance: 1.2nH
Inductor, 1.2nH, 80mΩ, 400mA, SMD 0402; Manufacturer: microgate; Manufacturer Part Number: MGCI1005T1N2ST-LF; Package Size: 0402; JLCPCB Basic Part: No; JLCPCB Part Number: C280986; Supplier 1: LCSC; Category: Inductors; Supplier Part Number 1: C280986; Rated Current: 400mA; DC Resistance: 80mΩ; RoHS: Yes; ComponentLink1Description: Datasheet; ComponentLink1URL: https://wmsc.lcsc.com/wmsc/upload/file/pdf/v2/lcsc/2304140030_microgate-MGCI1005T1N2ST-LF_C280986.pdf; ComponentLink2Description: JLCPCB Part URL; ComponentLink2URL: https://jlcpcb.com/partdetail/C280986; ComponentLink3Description: LCSC Part URL; ComponentLink3URL: https://lcsc.com/product-detail/Inductors-SMD_microgate-microgate-MGCI1005T1N2ST-LF_C280986.html
footprint IND-0402 (0402 (1005M) Inductor)
pins: 1, 2

## MGCI1005T1N5ST-LF
designator L?  Inductance: 1.5nH
Inductor, 1.5nH, 100mΩ, 400mA, SMD 0402; Manufacturer: microgate; Manufacturer Part Number: MGCI1005T1N5ST-LF; Package Size: 0402; JLCPCB Basic Part: No; JLCPCB Part Number: C280987; Supplier 1: LCSC; Category: Inductors; Supplier Part Number 1: C280987; Rated Current: 400mA; DC Resistance: 100mΩ; RoHS: Yes; ComponentLink1Description: Datasheet; ComponentLink1URL: https://wmsc.lcsc.com/wmsc/upload/file/pdf/v2/lcsc/2304140030_microgate-MGCI1005T1N5ST-LF_C280987.pdf; ComponentLink2Description: JLCPCB Part URL; ComponentLink2URL: https://jlcpcb.com/partdetail/C280987; ComponentLink3Description: LCSC Part URL; ComponentLink3URL: https://lcsc.com/product-detail/Inductors-SMD_microgate-microgate-MGCI1005T1N5ST-LF_C280987.html
footprint IND-0402 (0402 (1005M) Inductor)
pins: 1, 2

## MGCI1005T1N8ST-LF
designator L?  Inductance: 1.8nH
Inductor, 1.8nH, 120mΩ, 400mA, SMD 0402; Manufacturer: microgate; Manufacturer Part Number: MGCI1005T1N8ST-LF; Package Size: 0402; JLCPCB Basic Part: No; JLCPCB Part Number: C280988; Supplier 1: LCSC; Category: Inductors; Supplier Part Number 1: C280988; Rated Current: 400mA; DC Resistance: 120mΩ; RoHS: Yes; ComponentLink1Description: Datasheet; ComponentLink1URL: https://wmsc.lcsc.com/wmsc/upload/file/pdf/v2/lcsc/2304140030_microgate-MGCI1005T1N8ST-LF_C280988.pdf; ComponentLink2Description: JLCPCB Part URL; ComponentLink2URL: https://jlcpcb.com/partdetail/C280988; ComponentLink3Description: LCSC Part URL; ComponentLink3URL: https://lcsc.com/product-detail/Inductors-SMD_microgate-microgate-MGCI1005T1N8ST-LF_C280988.html
footprint IND-0402 (0402 (1005M) Inductor)
pins: 1, 2

## MGCI1005T2N2ST-LF
designator L?  Inductance: 2.2nH
Inductor, 2.2nH, 120mΩ, 400mA, SMD 0402; Manufacturer: microgate; Manufacturer Part Number: MGCI1005T2N2ST-LF; Package Size: 0402; JLCPCB Basic Part: No; JLCPCB Part Number: C280991; Supplier 1: LCSC; Category: Inductors; Supplier Part Number 1: C280991; Rated Current: 400mA; DC Resistance: 120mΩ; RoHS: Yes; ComponentLink1Description: Datasheet; ComponentLink1URL: https://wmsc.lcsc.com/wmsc/upload/file/pdf/v2/lcsc/2304140030_microgate-MGCI1005T2N2ST-LF_C280991.pdf; ComponentLink2Description: JLCPCB Part URL; ComponentLink2URL: https://jlcpcb.com/partdetail/C280991; ComponentLink3Description: LCSC Part URL; ComponentLink3URL: https://lcsc.com/product-detail/Inductors-SMD_microgate-microgate-MGCI1005T2N2ST-LF_C280991.html
footprint IND-0402 (0402 (1005M) Inductor)
pins: 1, 2

## MGCI1005T2N4ST-LF
designator L?  Inductance: 2.4nH
Inductor, 2.4nH, 120mΩ, 400mA, SMD 0402; Manufacturer: microgate; Manufacturer Part Number: MGCI1005T2N4ST-LF; Package Size: 0402; JLCPCB Basic Part: No; JLCPCB Part Number: C280992; Supplier 1: LCSC; Category: Inductors; Supplier Part Number 1: C280992; Rated Current: 400mA; DC Resistance: 120mΩ; RoHS: Yes; ComponentLink1Description: Datasheet; ComponentLink1URL: https://wmsc.lcsc.com/wmsc/upload/file/pdf/v2/lcsc/2304140030_microgate-MGCI1005T2N4ST-LF_C280992.pdf; ComponentLink2Description: JLCPCB Part URL; ComponentLink2URL: https://jlcpcb.com/partdetail/C280992; ComponentLink3Description: LCSC Part URL; ComponentLink3URL: https://lcsc.com/product-detail/Inductors-SMD_microgate-microgate-MGCI1005T2N4ST-LF_C280992.html
footprint IND-0402 (0402 (1005M) Inductor)
pins: 1, 2

## MGCI1005T2N7ST-LF
designator L?  Inductance: 2.7nH
Inductor, 2.7nH, 130mΩ, 400mA, SMD 0402; Manufacturer: microgate; Manufacturer Part Number: MGCI1005T2N7ST-LF; Package Size: 0402; JLCPCB Basic Part: No; JLCPCB Part Number: C280993; Supplier 1: LCSC; Category: Inductors; Supplier Part Number 1: C280993; Rated Current: 400mA; DC Resistance: 130mΩ; RoHS: Yes; ComponentLink1Description: Datasheet; ComponentLink1URL: https://wmsc.lcsc.com/wmsc/upload/file/pdf/v2/lcsc/2304140030_microgate-MGCI1005T2N7ST-LF_C280993.pdf; ComponentLink2Description: JLCPCB Part URL; ComponentLink2URL: https://jlcpcb.com/partdetail/C280993; ComponentLink3Description: LCSC Part URL; ComponentLink3URL: https://lcsc.com/product-detail/Inductors-SMD_microgate-microgate-MGCI1005T2N7ST-LF_C280993.html
footprint IND-0402 (0402 (1005M) Inductor)
pins: 1, 2

## MGCI1005T3N3ST-LF
designator L?  Inductance: 3.3nH
Inductor, 3.3nH, 150mΩ, 400mA, SMD 0402; Manufacturer: microgate; Manufacturer Part Number: MGCI1005T3N3ST-LF; Package Size: 0402; JLCPCB Basic Part: No; JLCPCB Part Number: C280997; Supplier 1: LCSC; Category: Inductors; Supplier Part Number 1: C280997; Rated Current: 400mA; DC Resistance: 150mΩ; RoHS: Yes; ComponentLink1Description: Datasheet; ComponentLink1URL: https://wmsc.lcsc.com/wmsc/upload/file/pdf/v2/lcsc/2304140030_microgate-MGCI1005T3N3ST-LF_C280997.pdf; ComponentLink2Description: JLCPCB Part URL; ComponentLink2URL: https://jlcpcb.com/partdetail/C280997; ComponentLink3Description: LCSC Part URL; ComponentLink3URL: https://lcsc.com/product-detail/Inductors-SMD_microgate-microgate-MGCI1005T3N3ST-LF_C280997.html
footprint IND-0402 (0402 (1005M) Inductor)
pins: 1, 2

## MGCI1005T3N9ST-LF
designator L?  Inductance: 3.9nH
Inductor, 3.9nH, 210mΩ, 400mA, SMD 0402; Manufacturer: microgate; Manufacturer Part Number: MGCI1005T3N9ST-LF; Package Size: 0402; JLCPCB Basic Part: No; JLCPCB Part Number: C280998; Supplier 1: LCSC; Category: Inductors; Supplier Part Number 1: C280998; Rated Current: 400mA; DC Resistance: 210mΩ; RoHS: Yes; ComponentLink1Description: Datasheet; ComponentLink1URL: https://wmsc.lcsc.com/wmsc/upload/file/pdf/v2/lcsc/2304140030_microgate-MGCI1005T3N9ST-LF_C280998.pdf; ComponentLink2Description: JLCPCB Part URL; ComponentLink2URL: https://jlcpcb.com/partdetail/C280998; ComponentLink3Description: LCSC Part URL; ComponentLink3URL: https://lcsc.com/product-detail/Inductors-SMD_microgate-microgate-MGCI1005T3N9ST-LF_C280998.html
footprint IND-0402 (0402 (1005M) Inductor)
pins: 1, 2

## MGCI1005T4N3ST-LF
designator L?  Inductance: 4.3nH
Inductor, 4.3nH, 210mΩ, 300mA, SMD 0402; Manufacturer: microgate; Manufacturer Part Number: MGCI1005T4N3ST-LF; Package Size: 0402; JLCPCB Basic Part: No; JLCPCB Part Number: C281000; Supplier 1: LCSC; Category: Inductors; Supplier Part Number 1: C281000; Rated Current: 300mA; DC Resistance: 210mΩ; RoHS: Yes; ComponentLink1Description: Datasheet; ComponentLink1URL: https://wmsc.lcsc.com/wmsc/upload/file/pdf/v2/lcsc/2304140030_microgate-MGCI1005T4N3ST-LF_C281000.pdf; ComponentLink2Description: JLCPCB Part URL; ComponentLink2URL: https://jlcpcb.com/partdetail/C281000; ComponentLink3Description: LCSC Part URL; ComponentLink3URL: https://lcsc.com/product-detail/Inductors-SMD_microgate-microgate-MGCI1005T4N3ST-LF_C281000.html
footprint IND-0402 (0402 (1005M) Inductor)
pins: 1, 2

## MGCI1005T4N7ST-LF
designator L?  Inductance: 4.7nH
Inductor, 4.7nH, 210mΩ, 300mA, SMD 0402; Manufacturer: microgate; Manufacturer Part Number: MGCI1005T4N7ST-LF; Package Size: 0402; JLCPCB Basic Part: No; JLCPCB Part Number: C281001; Supplier 1: LCSC; Category: Inductors; Supplier Part Number 1: C281001; Rated Current: 300mA; DC Resistance: 210mΩ; RoHS: Yes; ComponentLink1Description: Datasheet; ComponentLink1URL: https://wmsc.lcsc.com/wmsc/upload/file/pdf/v2/lcsc/2304140030_microgate-MGCI1005T4N7ST-LF_C281001.pdf; ComponentLink2Description: JLCPCB Part URL; ComponentLink2URL: https://jlcpcb.com/partdetail/C281001; ComponentLink3Description: LCSC Part URL; ComponentLink3URL: https://lcsc.com/product-detail/Inductors-SMD_microgate-microgate-MGCI1005T4N7ST-LF_C281001.html
footprint IND-0402 (0402 (1005M) Inductor)
pins: 1, 2

## MGCI1005T5N6ST-LF
designator L?  Inductance: 5.6nH
Inductor, 5.6nH, 230mΩ, 300mA, SMD 0402; Manufacturer: microgate; Manufacturer Part Number: MGCI1005T5N6ST-LF; Package Size: 0402; JLCPCB Basic Part: No; JLCPCB Part Number: C281004; Supplier 1: LCSC; Category: Inductors; Supplier Part Number 1: C281004; Rated Current: 300mA; DC Resistance: 230mΩ; RoHS: Yes; ComponentLink1Description: Datasheet; ComponentLink1URL: https://wmsc.lcsc.com/wmsc/upload/file/pdf/v2/lcsc/2304140030_microgate-MGCI1005T5N6ST-LF_C281004.pdf; ComponentLink2Description: JLCPCB Part URL; ComponentLink2URL: https://jlcpcb.com/partdetail/C281004; ComponentLink3Description: LCSC Part URL; ComponentLink3URL: https://lcsc.com/product-detail/Inductors-SMD_microgate-microgate-MGCI1005T5N6ST-LF_C281004.html
footprint IND-0402 (0402 (1005M) Inductor)
pins: 1, 2

## MGCI1005T6N2JT-LF
designator L?  Inductance: 6.2nH
Inductor, 6.2nH, ±5%, 250mΩ, 300mA, SMD 0402; Manufacturer: microgate; Manufacturer Part Number: MGCI1005T6N2JT-LF; Package Size: 0402; JLCPCB Basic Part: No; JLCPCB Part Number: C310870; Supplier 1: LCSC; Category: Inductors; Supplier Part Number 1: C310870; Tolerance: ±5%; Rated Current: 300mA; DC Resistance: 250mΩ; RoHS: Yes; ComponentLink1Description: Datasheet; ComponentLink1URL: https://wmsc.lcsc.com/wmsc/upload/file/pdf/v2/lcsc/2304140030_microgate-MGCI1005T6N2JT-LF_C310870.pdf; ComponentLink2Description: JLCPCB Part URL; ComponentLink2URL: https://jlcpcb.com/partdetail/C310870; ComponentLink3Description: LCSC Part URL; ComponentLink3URL: https://lcsc.com/product-detail/Inductors-SMD_microgate-microgate-MGCI1005T6N2JT-LF_C310870.html
footprint IND-0402 (0402 (1005M) Inductor)
pins: 1, 2

## MGCI1005T6N2ST-LF
designator L?  Inductance: 6.2nH
Inductor, 6.2nH, 250mΩ, 300mA, SMD 0402; Manufacturer: microgate; Manufacturer Part Number: MGCI1005T6N2ST-LF; Package Size: 0402; JLCPCB Basic Part: No; JLCPCB Part Number: C281006; Supplier 1: LCSC; Category: Inductors; Supplier Part Number 1: C281006; Rated Current: 300mA; DC Resistance: 250mΩ; RoHS: Yes; ComponentLink1Description: Datasheet; ComponentLink1URL: https://wmsc.lcsc.com/wmsc/upload/file/pdf/v2/lcsc/2304140030_microgate-MGCI1005T6N2ST-LF_C281006.pdf; ComponentLink2Description: JLCPCB Part URL; ComponentLink2URL: https://jlcpcb.com/partdetail/C281006; ComponentLink3Description: LCSC Part URL; ComponentLink3URL: https://lcsc.com/product-detail/Inductors-SMD_microgate-microgate-MGCI1005T6N2ST-LF_C281006.html
footprint IND-0402 (0402 (1005M) Inductor)
pins: 1, 2

## MGCI1005T6N8JT-LF
designator L?  Inductance: 6.8nH
Inductor, 6.8nH, ±5%, 250mΩ, 300mA, SMD 0402; Manufacturer: microgate; Manufacturer Part Number: MGCI1005T6N8JT-LF; Package Size: 0402; JLCPCB Basic Part: No; JLCPCB Part Number: C310871; Supplier 1: LCSC; Category: Inductors; Supplier Part Number 1: C310871; Tolerance: ±5%; Rated Current: 300mA; DC Resistance: 250mΩ; RoHS: Yes; ComponentLink1Description: Datasheet; ComponentLink1URL: https://wmsc.lcsc.com/wmsc/upload/file/pdf/v2/lcsc/2304140030_microgate-MGCI1005T6N8JT-LF_C310871.pdf; ComponentLink2Description: JLCPCB Part URL; ComponentLink2URL: https://jlcpcb.com/partdetail/C310871; ComponentLink3Description: LCSC Part URL; ComponentLink3URL: https://lcsc.com/product-detail/Inductors-SMD_microgate-microgate-MGCI1005T6N8JT-LF_C310871.html
footprint IND-0402 (0402 (1005M) Inductor)
pins: 1, 2

## MGCI1005T6N8ST-LF
designator L?  Inductance: 6.8nH
Inductor, 6.8nH, 250mΩ, 300mA, SMD 0402; Manufacturer: microgate; Manufacturer Part Number: MGCI1005T6N8ST-LF; Package Size: 0402; JLCPCB Basic Part: No; JLCPCB Part Number: C281007; Supplier 1: LCSC; Category: Inductors; Supplier Part Number 1: C281007; Rated Current: 300mA; DC Resistance: 250mΩ; RoHS: Yes; ComponentLink1Description: Datasheet; ComponentLink1URL: https://wmsc.lcsc.com/wmsc/upload/file/pdf/v2/lcsc/2304140030_microgate-MGCI1005T6N8ST-LF_C281007.pdf; ComponentLink2Description: JLCPCB Part URL; ComponentLink2URL: https://jlcpcb.com/partdetail/C281007; ComponentLink3Description: LCSC Part URL; ComponentLink3URL: https://lcsc.com/product-detail/Inductors-SMD_microgate-microgate-MGCI1005T6N8ST-LF_C281007.html
footprint IND-0402 (0402 (1005M) Inductor)
pins: 1, 2

## MGCI1005T7N5ST-LF
designator L?  Inductance: 7.5nH
Inductor, 7.5nH, 350mΩ, 300mA, SMD 0402; Manufacturer: microgate; Manufacturer Part Number: MGCI1005T7N5ST-LF; Package Size: 0402; JLCPCB Basic Part: No; JLCPCB Part Number: C281008; Supplier 1: LCSC; Category: Inductors; Supplier Part Number 1: C281008; Rated Current: 300mA; DC Resistance: 350mΩ; RoHS: Yes; ComponentLink1Description: Datasheet; ComponentLink1URL: https://wmsc.lcsc.com/wmsc/upload/file/pdf/v2/lcsc/2304140030_microgate-MGCI1005T7N5ST-LF_C281008.pdf; ComponentLink2Description: JLCPCB Part URL; ComponentLink2URL: https://jlcpcb.com/partdetail/C281008; ComponentLink3Description: LCSC Part URL; ComponentLink3URL: https://lcsc.com/product-detail/Inductors-SMD_microgate-microgate-MGCI1005T7N5ST-LF_C281008.html
footprint IND-0402 (0402 (1005M) Inductor)
pins: 1, 2
